# Altium integrated library Connectors.IntLib: 512 symbols (part 2 of 2) (continued)
## TermBlock_2Х7.5
designator KLV?  (value not drawn)
Note: Connector; Temp.Characteristic: -40C to +85C; Value: *; Publisher: Catcatcat Electronics; Website developer: http://catcatcat.d-lan.dp.ua/; Assembly type: Manual Part
footprint TermBlock_2Х7.5
pins: 1, 2

## TermBlock_2Х7.5R
designator KLR?  (value not drawn)
Note: Connector; Temp.Characteristic: -40C to +85C; Value: *; Publisher: Catcatcat Electronics; Website developer: http://catcatcat.d-lan.dp.ua/; Assembly type: Manual Part
footprint TermBlock_2Х7.5R
pins: 1, 2

## TermBlock_3Х3.5
designator KLV?  (value not drawn)
Note: Connector; Temp.Characteristic: -40C to +85C; Value: *; Publisher: Catcatcat Electronics; Website developer: http://catcatcat.d-lan.dp.ua/; Assembly type: Manual Part
footprint TermBlock_3Х3.5
pins: 1, 2, 3

## TermBlock_3Х5
designator KLV?  (value not drawn)
Note: Connector; Temp.Characteristic: -40C to +85C; Value: *; Publisher: Catcatcat Electronics; Website developer: http://catcatcat.d-lan.dp.ua/; Assembly type: Manual Part
footprint TermBlock_3Х5
pins: 1, 2, 3

## TermBlock_4
designator U?  (value not drawn)
Note: Connector; Temp.Characteristic: -40C to +85C; Value: *; Publisher: Catcatcat Electronics; Website developer: http://catcatcat.d-lan.dp.ua/; Assembly type: Manual Part
footprint TermBlock_4
pins: 1, 2, 3, 4

## USB-A-PLUG-SMT
designator DP?  (value not drawn)
Note: Connector; Temp.Characteristic: -40C to +85C; Value: *; Publisher: Catcatcat Electronics; Website developer: http://catcatcat.d-lan.dp.ua/; Assembly type: Manual Part
footprint USB-A-PLUG-SMT
pins: 1 Vdd, 2 D-, 3 D+, 4 Vss, 5 hidden, 6 hidden, 7 hidden, 8 hidden, 9 hidden, 10 hidden

## USB-A-RECEPTACLE-SMT
designator CON?  (value not drawn)
Note: Connector; Temp.Characteristic: -40C to +85C; Value: *; Publisher: Catcatcat Electronics; Website developer: http://catcatcat.d-lan.dp.ua/; Assembly type: Manual Part
footprint USB-A-RECEPTACLE
pins: 1 Vdd, 2 D-, 3 D+, 4 Vss, 5 hidden, 6 hidden

## USB-B
designator CON?  (value not drawn)
Note: Connector; Temp.Characteristic: -40C to +85C; Value: *; Publisher: Catcatcat Electronics; Website developer: http://catcatcat.d-lan.dp.ua/; Assembly type: Manual Part
footprint USB-B
pins: 1 Vcc, 2 D-, 3 D+, 4 Vss, 5 GND, 6 GND

## USB-B-MICRO
designator CON?  (value not drawn)
Note: Connector; Temp.Characteristic: -40C to +85C; Value: *; Publisher: Catcatcat Electronics; Website developer: http://catcatcat.d-lan.dp.ua/; Assembly type: Manual Part
footprint USB-B-MICRO
pins: 1 VUSB, 2 D-, 3 D+, 4 ID, 5 GND, 6 shield, 7 shield, 8 shield, 9 shield
text: micro-USB

## USB-B-RECEPTACLE
designator CON?  (value not drawn)
Note: Connector; Temp.Characteristic: -40C to +85C; Value: *; Publisher: Catcatcat Electronics; Website developer: http://catcatcat.d-lan.dp.ua/; Assembly type: Manual Part
footprint USB-B-RECEPTACLE
pins: 1 Vdd, 2 D-, 3 D+, 4 Vss, 5 GND, 6 GND, 7 hidden, 8 hidden

## USB-DS1095
designator CON?  (value not drawn)
Note: Connector; Temp.Characteristic: -40C to +85C; Value: *; Publisher: Catcatcat Electronics; Website developer: http://catcatcat.d-lan.dp.ua/; Assembly type: Manual Part
footprint USB-DS1095
pins: 1 Vdd, 2 D-, 3 D+, 4 Vss, 5 hidden, 6 hidden

## VL22
designator CON?  (value not drawn)
3.5 mm 300 V 8 A; Value: 15EDGR-3.5-12; Note: Connector; Temp.Characteristic: -40C to +85C; Voltage: 300 V 8 A; Package / Case: 3.5 mm; PartNumber Digi-Key: 15EDGR-3.5-12; Publisher: Catcatcat Electronics; Manufacturer: http://www.anytek.com.tw; Website developer: http://catcatcat.d-lan.dp.ua/; Assembly type: Manual Part
footprint VL22
pins: 1, 2, 3, 4, 5, 6, 7, 8, 9, 10, 11, 12, 13, 14, 15, 16, 17, 18, 19, 20, 21, 22

## VL24
designator CON?  (value not drawn)
3.5 mm 300 V 8 A; Value: 15EDGR-3.5-12; Note: Connector; Temp.Characteristic: -40C to +85C; Voltage: 300 V 8 A; Package / Case: 3.5 mm; PartNumber Digi-Key: 15EDGR-3.5-12; Publisher: Catcatcat Electronics; Manufacturer: http://www.anytek.com.tw; Website developer: http://catcatcat.d-lan.dp.ua/; Assembly type: Manual Part
footprint VL24
pins: 1, 2, 3, 4, 5, 6, 7, 8, 9, 10, 11, 12, 13, 14, 15, 16, 17, 18, 19, 20, 21, 22, 23, 24

## VL 04 1 3 x 1 0000 G
designator X?  (value not drawn)
3.5 mm 2*2P - 2*24P; Value: 2EDGRC-5.08-02; Pricing Аlternative: 0.006; Note: Connector; Temp.Characteristic: -40C to +85C; Voltage: 300 V; Package / Case: 5.08 mm; PartNumber Digi-Key: 2EDGRC-5.08-02; Pricing Digi-Key: 0.064; Publisher: Catcatcat Electronics; HelpURL: http://www.anytek.com.tw/UserUpFiles/20100614/4OFCs_FTjbzs.pdf; Manufacturer: http://www.anytek.com.tw/EN/index.aspx; Website developer: http://catcatcat.d-lan.dp.ua/; Assembly type: Manual Part
footprint VL 04 1 3 x 1 xxxx G
pins: 1, 2, 3, 4

## VL 06 1 3 x 1 0000 G
designator X?  (value not drawn)
3.5 mm 2*2P - 2*24P; Value: 2EDGRC-5.08-02; Pricing Аlternative: 0.006; Note: Connector; Temp.Characteristic: -40C to +85C; Voltage: 300 V; Package / Case: 5.08 mm; PartNumber Digi-Key: 2EDGRC-5.08-02; Pricing Digi-Key: 0.064; Publisher: Catcatcat Electronics; HelpURL: http://www.anytek.com.tw/UserUpFiles/20100614/4OFCs_FTjbzs.pdf; Manufacturer: http://www.anytek.com.tw/EN/index.aspx; Website developer: http://catcatcat.d-lan.dp.ua/; Assembly type: Manual Part
footprint VL 06 1 3 x 1 xxxx G
pins: 1, 2, 3, 4, 5, 6

## VL 08 1 3 x 1 0000 G
designator X?  (value not drawn)
3.5 mm 2*2P - 2*24P; Value: 2EDGRC-5.08-02; Pricing Аlternative: 0.006; Note: Connector; Temp.Characteristic: -40C to +85C; Voltage: 300 V; Package / Case: 5.08 mm; PartNumber Digi-Key: 2EDGRC-5.08-02; Pricing Digi-Key: 0.064; Publisher: Catcatcat Electronics; HelpURL: http://www.anytek.com.tw/UserUpFiles/20100614/4OFCs_FTjbzs.pdf; Manufacturer: http://www.anytek.com.tw/EN/index.aspx; Website developer: http://catcatcat.d-lan.dp.ua/; Assembly type: Manual Part
footprint VL 08 1 3 x 1 xxxx G
pins: 1, 2, 3, 4, 5, 6, 7, 8

## VL 10 1 3 x 1 0000 G
designator X?  (value not drawn)
3.5 mm 2*2P - 2*24P; Value: 2EDGRC-5.08-02; Pricing Аlternative: 0.006; Note: Connector; Temp.Characteristic: -40C to +85C; Voltage: 300 V; Package / Case: 5.08 mm; PartNumber Digi-Key: 2EDGRC-5.08-02; Pricing Digi-Key: 0.064; Publisher: Catcatcat Electronics; HelpURL: http://www.anytek.com.tw/UserUpFiles/20100614/4OFCs_FTjbzs.pdf; Manufacturer: http://www.anytek.com.tw/EN/index.aspx; Website developer: http://catcatcat.d-lan.dp.ua/; Assembly type: Manual Part
footprint VL 10 1 3 x 1 xxxx G
pins: 1, 2, 3, 4, 5, 6, 7, 8, 9, 10

## VL 12 1 3 x 1 0000 G
designator X?  (value not drawn)
3.5 mm 2*2P - 2*24P; Value: 2EDGRC-5.08-02; Pricing Аlternative: 0.006; Note: Connector; Temp.Characteristic: -40C to +85C; Voltage: 300 V; Package / Case: 5.08 mm; PartNumber Digi-Key: 2EDGRC-5.08-02; Pricing Digi-Key: 0.064; Publisher: Catcatcat Electronics; HelpURL: http://www.anytek.com.tw/UserUpFiles/20100614/4OFCs_FTjbzs.pdf; Manufacturer: http://www.anytek.com.tw/EN/index.aspx; Website developer: http://catcatcat.d-lan.dp.ua/; Assembly type: Manual Part
footprint VL 12 1 3 x 1 xxxx G
pins: 1, 2, 3, 4, 5, 6, 7, 8, 9, 10, 11, 12

## VX 04 1 1 x 1 xxxx G
designator X?  (value not drawn)
3.5 mm 2*2P - 2*24P; Value: 2EDGRC-5.08-02; Pricing Аlternative: 0.006; Note: Connector; Temp.Characteristic: -40C to +85C; Voltage: 300 V; Package / Case: 5.08 mm; PartNumber Digi-Key: 2EDGRC-5.08-02; Pricing Digi-Key: 0.064; Publisher: Catcatcat Electronics; HelpURL: http://www.anytek.com.tw/UserUpFiles/20100614/4OFCs_FTjbzs.pdf; Manufacturer: http://www.anytek.com.tw/EN/index.aspx; Website developer: http://catcatcat.d-lan.dp.ua/; Assembly type: Manual Part
footprint VX 04 1 1 x 1 xxxx G
pins: 1, 2, 3, 4

## VX 06 1 1 x 1 xxxx G
designator X?  (value not drawn)
3.5 mm 2*2P - 2*24P; Value: 2EDGRC-5.08-02; Pricing Аlternative: 0.006; Note: Connector; Temp.Characteristic: -40C to +85C; Voltage: 300 V; Package / Case: 5.08 mm; PartNumber Digi-Key: 2EDGRC-5.08-02; Pricing Digi-Key: 0.064; Publisher: Catcatcat Electronics; HelpURL: http://www.anytek.com.tw/UserUpFiles/20100614/4OFCs_FTjbzs.pdf; Manufacturer: http://www.anytek.com.tw/EN/index.aspx; Website developer: http://catcatcat.d-lan.dp.ua/; Assembly type: Manual Part
footprint VX 06 1 1 x 1 xxxx G
pins: 1, 2, 3, 4, 5, 6

## VX 08 1 1 x 1 xxxx G
designator X?  (value not drawn)
3.5 mm 2*2P - 2*24P; Value: 2EDGRC-5.08-02; Pricing Аlternative: 0.006; Note: Connector; Temp.Characteristic: -40C to +85C; Voltage: 300 V; Package / Case: 5.08 mm; PartNumber Digi-Key: 2EDGRC-5.08-02; Pricing Digi-Key: 0.064; Publisher: Catcatcat Electronics; HelpURL: http://www.anytek.com.tw/UserUpFiles/20100614/4OFCs_FTjbzs.pdf; Manufacturer: http://www.anytek.com.tw/EN/index.aspx; Website developer: http://catcatcat.d-lan.dp.ua/; Assembly type: Manual Part
footprint VX 08 1 1 x 1 xxxx G
pins: 1, 2, 3, 4, 5, 6, 7, 8

## VX 10 1 1 x 1 xxxx G
designator X?  (value not drawn)
3.5 mm 2*2P - 2*24P; Value: 2EDGRC-5.08-02; Pricing Аlternative: 0.006; Note: Connector; Temp.Characteristic: -40C to +85C; Voltage: 300 V; Package / Case: 5.08 mm; PartNumber Digi-Key: 2EDGRC-5.08-02; Pricing Digi-Key: 0.064; Publisher: Catcatcat Electronics; HelpURL: http://www.anytek.com.tw/UserUpFiles/20100614/4OFCs_FTjbzs.pdf; Manufacturer: http://www.anytek.com.tw/EN/index.aspx; Website developer: http://catcatcat.d-lan.dp.ua/; Assembly type: Manual Part
footprint VX 10 1 1 x 1 xxxx G
pins: 1, 2, 3, 4, 5, 6, 7, 8, 9, 10

## VX 12 1 1 x 1 xxxx G
designator X?  (value not drawn)
3.5 mm 2*2P - 2*24P; Value: 2EDGRC-5.08-02; Pricing Аlternative: 0.006; Note: Connector; Temp.Characteristic: -40C to +85C; Voltage: 300 V; Package / Case: 5.08 mm; PartNumber Digi-Key: 2EDGRC-5.08-02; Pricing Digi-Key: 0.064; Publisher: Catcatcat Electronics; HelpURL: http://www.anytek.com.tw/UserUpFiles/20100614/4OFCs_FTjbzs.pdf; Manufacturer: http://www.anytek.com.tw/EN/index.aspx; Website developer: http://catcatcat.d-lan.dp.ua/; Assembly type: Manual Part
footprint VX 12 1 1 x 1 xxxx G
pins: 1, 2, 3, 4, 5, 6, 7, 8, 9, 10, 11, 12

## WH-2
designator CON?  (value not drawn)
Note: Connector; Temp.Characteristic: -40C to +85C; Value: *; Publisher: Catcatcat Electronics; Website developer: http://catcatcat.d-lan.dp.ua/; Assembly type: Manual Part
footprint WH-2
pins: 1, 2

## WH-2R
designator CON?  (value not drawn)
Note: Connector; Temp.Characteristic: -40C to +85C; Value: *; Publisher: Catcatcat Electronics; Website developer: http://catcatcat.d-lan.dp.ua/; Assembly type: Manual Part
footprint WH-2R
pins: 1, 2

## WH-3
designator CON?  (value not drawn)
Note: Connector; Temp.Characteristic: -40C to +85C; Value: *; Publisher: Catcatcat Electronics; Website developer: http://catcatcat.d-lan.dp.ua/; Assembly type: Manual Part
footprint WH-3
pins: 1, 2, 3

## WH-3R
designator CON?  (value not drawn)
Note: Connector; Temp.Characteristic: -40C to +85C; Value: *; Publisher: Catcatcat Electronics; Website developer: http://catcatcat.d-lan.dp.ua/; Assembly type: Manual Part
footprint WH-3R
pins: 1, 2, 3

## WH-4
designator CON?  (value not drawn)
Note: Connector; Temp.Characteristic: -40C to +85C; Value: *; Publisher: Catcatcat Electronics; Website developer: http://catcatcat.d-lan.dp.ua/; Assembly type: Manual Part
footprint WH-4
pins: 1, 2, 3, 4

## WH-4R
designator CON?  (value not drawn)
Note: Connector; Temp.Characteristic: -40C to +85C; Value: *; Publisher: Catcatcat Electronics; Website developer: http://catcatcat.d-lan.dp.ua/; Assembly type: Manual Part
footprint WH-4R
pins: 1, 2, 3, 4

## WH-5
designator CON?  (value not drawn)
Note: Connector; Temp.Characteristic: -40C to +85C; Value: *; Publisher: Catcatcat Electronics; Website developer: http://catcatcat.d-lan.dp.ua/; Assembly type: Manual Part
footprint WH-5
pins: 1, 2, 3, 4, 5

## WH-5R
designator CON?  (value not drawn)
Note: Connector; Temp.Characteristic: -40C to +85C; Value: *; Publisher: Catcatcat Electronics; Website developer: http://catcatcat.d-lan.dp.ua/; Assembly type: Manual Part
footprint WH-5R
pins: 1, 2, 3, 4, 5

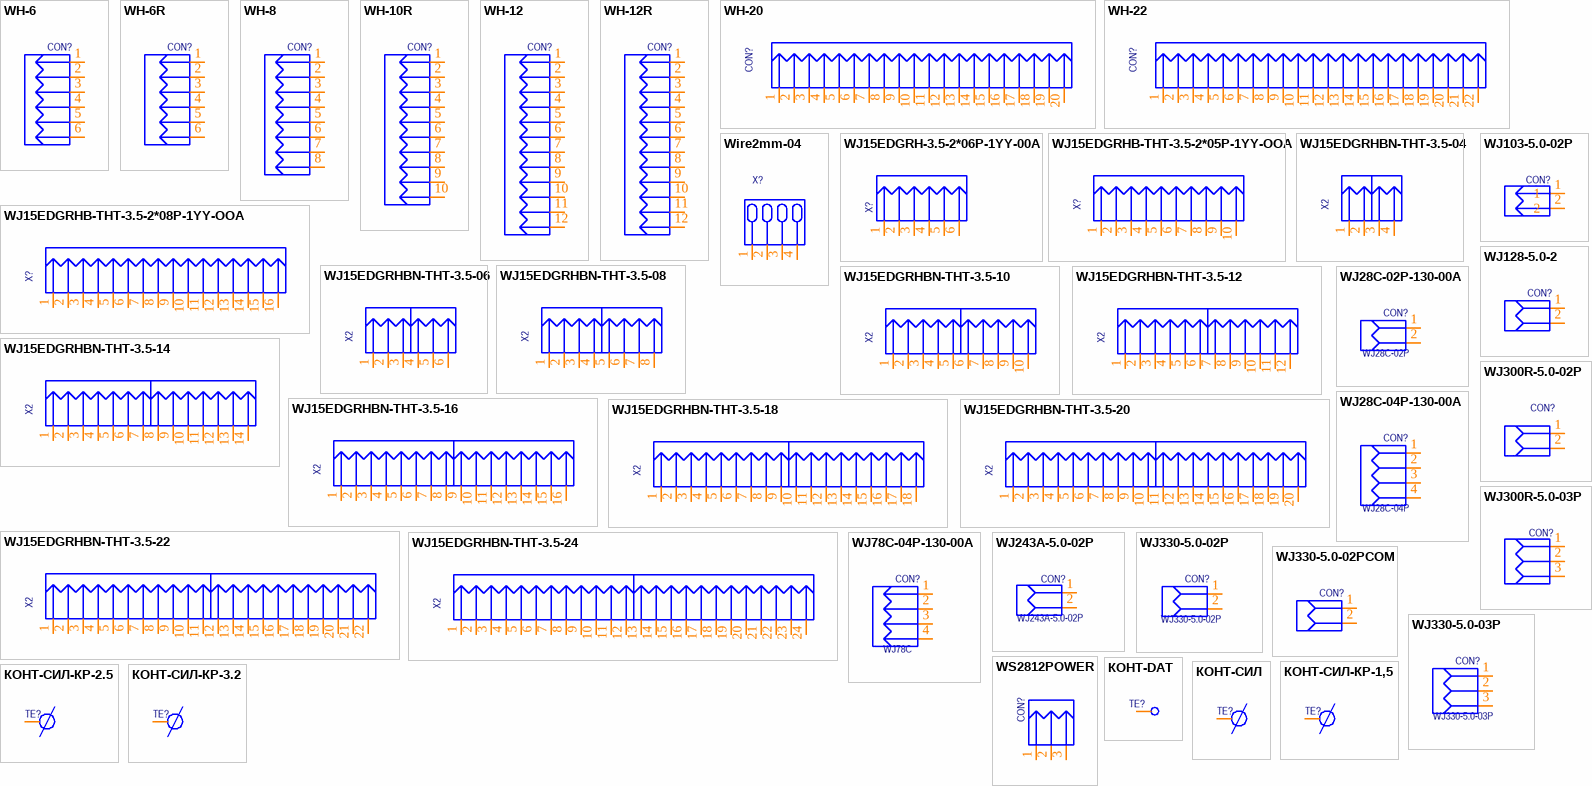
[diagram p12: symbols WH-6 to КОНТ-СИЛ-КР-3.2]

## WH-6
designator CON?  (value not drawn)
Note: Connector; Temp.Characteristic: -40C to +85C; Value: *; Publisher: Catcatcat Electronics; Website developer: http://catcatcat.d-lan.dp.ua/; Assembly type: Manual Part
footprint WH-6
pins: 1, 2, 3, 4, 5, 6

## WH-6R
designator CON?  (value not drawn)
Note: Connector; Temp.Characteristic: -40C to +85C; Value: *; Publisher: Catcatcat Electronics; Website developer: http://catcatcat.d-lan.dp.ua/; Assembly type: Manual Part
footprint WH-6R
pins: 1, 2, 3, 4, 5, 6

## WH-8
designator CON?  (value not drawn)
Note: Connector; Temp.Characteristic: -40C to +85C; Value: *; Publisher: Catcatcat Electronics; Website developer: http://catcatcat.d-lan.dp.ua/; Assembly type: Manual Part
footprint WH-8
pins: 1, 2, 3, 4, 5, 6, 7, 8

## WH-10R
designator CON?  (value not drawn)
Note: Connector; Temp.Characteristic: -40C to +85C; Value: *; Publisher: Catcatcat Electronics; Website developer: http://catcatcat.d-lan.dp.ua/; Assembly type: Manual Part
footprint WH-10R
pins: 1, 2, 3, 4, 5, 6, 7, 8, 9, 10

## WH-12
designator CON?  (value not drawn)
Note: Connector; Temp.Characteristic: -40C to +85C; Value: *; Publisher: Catcatcat Electronics; Website developer: http://catcatcat.d-lan.dp.ua/; Assembly type: Manual Part
footprint WH-12
pins: 1, 2, 3, 4, 5, 6, 7, 8, 9, 10, 11, 12

## WH-12R
designator CON?  (value not drawn)
Note: Connector; Temp.Characteristic: -40C to +85C; Value: *; Publisher: Catcatcat Electronics; Website developer: http://catcatcat.d-lan.dp.ua/; Assembly type: Manual Part
footprint WH-12R
pins: 1, 2, 3, 4, 5, 6, 7, 8, 9, 10, 11, 12

## WH-20
designator CON?  (value not drawn)
Note: Connector; Temp.Characteristic: -40C to +85C; Value: *; Publisher: Catcatcat Electronics; Website developer: http://catcatcat.d-lan.dp.ua/; Assembly type: Manual Part
footprint WH-20
pins: 1, 2, 3, 4, 5, 6, 7, 8, 9, 10, 11, 12, 13, 14, 15, 16, 17, 18, 19, 20

## WH-22
designator CON?  (value not drawn)
Note: Connector; Temp.Characteristic: -40C to +85C; Value: *; Publisher: Catcatcat Electronics; Website developer: http://catcatcat.d-lan.dp.ua/; Assembly type: Manual Part
footprint WH-22
pins: 1, 2, 3, 4, 5, 6, 7, 8, 9, 10, 11, 12, 13, 14, 15, 16, 17, 18, 19, 20, 21, 22

## Wire2mm-04
designator X?  (value not drawn)
2.0 mm; Value: 5*2mm; Pricing Аlternative: 0; Note: Connector; Temp.Characteristic: -40C to +85C; Pricing Digi-Key: 0; Publisher: Catcatcat Electronics; Manufacturer: http://www.jinlingdz.com; Website developer: http://catcatcat.d-lan.dp.ua/; Assembly type: Manual Part
footprint Wire2mm-04 (2.00 mm)
pins: 1, 2, 3, 4

## WJ15EDGRH-3.5-2*06P-1YY-00A
designator X?  (value not drawn)
3.5 mm 2*2P - 2*24P; Value: 2EDGRC-5.08-02; Pricing Аlternative: 0.006; Note: Connector; Temp.Characteristic: -40C to +85C; Voltage: 300 V; Package / Case: 5.08 mm; PartNumber Digi-Key: 2EDGRC-5.08-02; Pricing Digi-Key: 0.064; Publisher: Catcatcat Electronics; HelpURL: http://www.anytek.com.tw/UserUpFiles/20100614/4OFCs_FTjbzs.pdf; Manufacturer: http://www.anytek.com.tw/EN/index.aspx; Website developer: http://catcatcat.d-lan.dp.ua/; Assembly type: Manual Part
footprint WJ15EDGRH-3.5-2*06P-1YY-00A
pins: 1, 2, 3, 4, 5, 6

## WJ15EDGRHB-THT-3.5-2*05P-1YY-OOA
designator X?  (value not drawn)
3.5 mm 300V/8A; Manufacturer PartNumber: jx-017; Value: WJ15EDGRHBN-THT-3.5; Note: Connector; Temp.Characteristic: -40C to +85C; Package / Case: 3.5 mm; PartNumber Digi-Key: jx-017; Publisher: Catcatcat Electronics; Voltage: 300V/8A; Manufacturer: http://en.china-wj.com/index.html; Website developer: http://catcatcat.d-lan.dp.ua/; Assembly type: Manual Part
footprint WJ15EDGRHB-THT-3.5-2*05P-1YY-OOA
pins: 1, 2, 3, 4, 5, 6, 7, 8, 9, 10

## WJ15EDGRHB-THT-3.5-2*08P-1YY-OOA
designator X?  (value not drawn)
3.5 mm 300V/8A; Manufacturer PartNumber: jx-017; Value: WJ15EDGRHBN-THT-3.5; Note: Connector; Temp.Characteristic: -40C to +85C; Package / Case: 3.5 mm; PartNumber Digi-Key: jx-017; Publisher: Catcatcat Electronics; Voltage: 300V/8A; Manufacturer: http://en.china-wj.com/index.html; Website developer: http://catcatcat.d-lan.dp.ua/; Assembly type: Manual Part
footprint WJ15EDGRHB-THT-3.5-2*08P-1YY-OOA
pins: 1, 2, 3, 4, 5, 6, 7, 8, 9, 10, 11, 12, 13, 14, 15, 16

## WJ15EDGRHBN-THT-3.5-04
designator X2  (value not drawn)
3.5 mm 300V/8A; Manufacturer PartNumber: jx-017; Value: WJ15EDGRHBN-THT-3.5; Note: Connector; Temp.Characteristic: -40C to +85C; Package / Case: 3.5 mm; PartNumber Digi-Key: jx-017; Publisher: Catcatcat Electronics; Voltage: 300V/8A; Manufacturer: http://en.china-wj.com/index.html; Website developer: http://catcatcat.d-lan.dp.ua/; Assembly type: Manual Part
footprint WJ15EDGRHBN-THT-3.5-04
pins: 1, 2, 3, 4

## WJ15EDGRHBN-THT-3.5-06
designator X2  (value not drawn)
3.5 mm 300V/8A; Manufacturer PartNumber: jx-017; Value: WJ15EDGRHBN-THT-3.5; Note: Connector; Temp.Characteristic: -40C to +85C; Package / Case: 3.5 mm; PartNumber Digi-Key: jx-017; Publisher: Catcatcat Electronics; Voltage: 300V/8A; Manufacturer: http://en.china-wj.com/index.html; Website developer: http://catcatcat.d-lan.dp.ua/; Assembly type: Manual Part
footprint WJ15EDGRHBN-THT-3.5-06
pins: 1, 2, 3, 4, 5, 6

## WJ15EDGRHBN-THT-3.5-08
designator X2  (value not drawn)
3.5 mm 300V/8A; Manufacturer PartNumber: jx-017; Value: WJ15EDGRHBN-THT-3.5; Note: Connector; Temp.Characteristic: -40C to +85C; Package / Case: 3.5 mm; PartNumber Digi-Key: jx-017; Publisher: Catcatcat Electronics; Voltage: 300V/8A; Manufacturer: http://en.china-wj.com/index.html; Website developer: http://catcatcat.d-lan.dp.ua/; Assembly type: Manual Part
footprint WJ15EDGRHBN-THT-3.5-08
pins: 1, 2, 3, 4, 5, 6, 7, 8

## WJ15EDGRHBN-THT-3.5-10
designator X2  (value not drawn)
3.5 mm 300V/8A; Manufacturer PartNumber: jx-017; Value: WJ15EDGRHBN-THT-3.5; Note: Connector; Temp.Characteristic: -40C to +85C; Package / Case: 3.5 mm; PartNumber Digi-Key: jx-017; Publisher: Catcatcat Electronics; Voltage: 300V/8A; Manufacturer: http://en.china-wj.com/index.html; Website developer: http://catcatcat.d-lan.dp.ua/; Assembly type: Manual Part
footprint WJ15EDGRHBN-THT-3.5-10
pins: 1, 2, 3, 4, 5, 6, 7, 8, 9, 10

## WJ15EDGRHBN-THT-3.5-12
designator X2  (value not drawn)
3.5 mm 300V/8A; Manufacturer PartNumber: jx-017; Value: WJ15EDGRHBN-THT-3.5; Note: Connector; Temp.Characteristic: -40C to +85C; Package / Case: 3.5 mm; PartNumber Digi-Key: jx-017; Publisher: Catcatcat Electronics; Voltage: 300V/8A; Manufacturer: http://en.china-wj.com/index.html; Website developer: http://catcatcat.d-lan.dp.ua/; Assembly type: Manual Part
footprint WJ15EDGRHBN-THT-3.5-12
pins: 1, 2, 3, 4, 5, 6, 7, 8, 9, 10, 11, 12

## WJ15EDGRHBN-THT-3.5-14
designator X2  (value not drawn)
3.5 mm 300V/8A; Manufacturer PartNumber: jx-017; Value: WJ15EDGRHBN-THT-3.5; Note: Connector; Temp.Characteristic: -40C to +85C; Package / Case: 3.5 mm; PartNumber Digi-Key: jx-017; Publisher: Catcatcat Electronics; Voltage: 300V/8A; Manufacturer: http://en.china-wj.com/index.html; Website developer: http://catcatcat.d-lan.dp.ua/; Assembly type: Manual Part
footprint WJ15EDGRHBN-THT-3.5-14
pins: 1, 2, 3, 4, 5, 6, 7, 8, 9, 10, 11, 12, 13, 14

## WJ15EDGRHBN-THT-3.5-16
designator X2  (value not drawn)
3.5 mm 300V/8A; Manufacturer PartNumber: jx-017; Value: WJ15EDGRHBN-THT-3.5; Note: Connector; Temp.Characteristic: -40C to +85C; Package / Case: 3.5 mm; PartNumber Digi-Key: jx-017; Publisher: Catcatcat Electronics; Voltage: 300V/8A; Manufacturer: http://en.china-wj.com/index.html; Website developer: http://catcatcat.d-lan.dp.ua/; Assembly type: Manual Part
footprint WJ15EDGRHBN-THT-3.5-16
pins: 1, 2, 3, 4, 5, 6, 7, 8, 9, 10, 11, 12, 13, 14, 15, 16

## WJ15EDGRHBN-THT-3.5-18
designator X2  (value not drawn)
3.5 mm 300V/8A; Manufacturer PartNumber: jx-017; Value: WJ15EDGRHBN-THT-3.5; Note: Connector; Temp.Characteristic: -40C to +85C; Package / Case: 3.5 mm; PartNumber Digi-Key: jx-017; Publisher: Catcatcat Electronics; Voltage: 300V/8A; Manufacturer: http://en.china-wj.com/index.html; Website developer: http://catcatcat.d-lan.dp.ua/; Assembly type: Manual Part
footprint WJ15EDGRHBN-THT-3.5-18
pins: 1, 2, 3, 4, 5, 6, 7, 8, 9, 10, 11, 12, 13, 14, 15, 16, 17, 18

## WJ15EDGRHBN-THT-3.5-20
designator X2  (value not drawn)
3.5 mm 300V/8A; Manufacturer PartNumber: jx-017; Value: WJ15EDGRHBN-THT-3.5; Note: Connector; Temp.Characteristic: -40C to +85C; Package / Case: 3.5 mm; PartNumber Digi-Key: jx-017; Publisher: Catcatcat Electronics; Voltage: 300V/8A; Manufacturer: http://en.china-wj.com/index.html; Website developer: http://catcatcat.d-lan.dp.ua/; Assembly type: Manual Part
footprint WJ15EDGRHBN-THT-3.5-20
pins: 1, 2, 3, 4, 5, 6, 7, 8, 9, 10, 11, 12, 13, 14, 15, 16, 17, 18, 19, 20

## WJ15EDGRHBN-THT-3.5-22
designator X2  (value not drawn)
3.5 mm 300V/8A; Manufacturer PartNumber: jx-017; Value: WJ15EDGRHBN-THT-3.5; Note: Connector; Temp.Characteristic: -40C to +85C; Package / Case: 3.5 mm; PartNumber Digi-Key: jx-017; Publisher: Catcatcat Electronics; Voltage: 300V/8A; Manufacturer: http://en.china-wj.com/index.html; Website developer: http://catcatcat.d-lan.dp.ua/; Assembly type: Manual Part
footprint WJ15EDGRHBN-THT-3.5-22
pins: 1, 2, 3, 4, 5, 6, 7, 8, 9, 10, 11, 12, 13, 14, 15, 16, 17, 18, 19, 20, 21, 22

## WJ15EDGRHBN-THT-3.5-24
designator X2  (value not drawn)
3.5 mm 300V/8A; Manufacturer PartNumber: jx-017; Value: WJ15EDGRHBN-THT-3.5; Note: Connector; Temp.Characteristic: -40C to +85C; Package / Case: 3.5 mm; PartNumber Digi-Key: jx-017; Publisher: Catcatcat Electronics; Voltage: 300V/8A; Manufacturer: http://en.china-wj.com/index.html; Website developer: http://catcatcat.d-lan.dp.ua/; Assembly type: Manual Part
footprint WJ15EDGRHBN-THT-3.5-24
pins: 1, 2, 3, 4, 5, 6, 7, 8, 9, 10, 11, 12, 13, 14, 15, 16, 17, 18, 19, 20, 21, 22, 23, 24

## WJ28C-02P-130-00A
designator CON?  value WJ28C-02P  (hidden comment: WJ28C-02P-130-00A)
Note: Connector; Temp.Characteristic: -40C to +85C; Publisher: Catcatcat Electronics; Website developer: http://catcatcat.d-lan.dp.ua/; Assembly type: Manual Part
footprint WJ28C-02P
pins: 1, 2

## WJ28C-04P-130-00A
designator CON?  value WJ28C-04P  (hidden comment: *)
Note: Connector; Temp.Characteristic: -40C to +85C; Publisher: Catcatcat Electronics; Website developer: http://catcatcat.d-lan.dp.ua/; Assembly type: Manual Part
footprint WJ28C-04P
pins: 1, 2, 3, 4

## WJ78C-04P-130-00A
designator CON?  value WJ78C  (hidden comment: *)
Manufacturer: CIXI WANJIE ELECTRONIC CO., LTD; Manufacturer PartNumber: WJ78C-04P-130-00A; PartNumber Аlternative: 016844; Pricing Аlternative: 0,5050; Note: Connector; Temp.Characteristic: -40C to +85C; Voltage: 600V 40A; Dealer Аlternative: https://voron.ua/catalog/016844; Package / Case: 13mm; Publisher: Catcatcat Electronics; HelpURL: http://www.china-wj.com/En/product_detail1/id/300.html; Website developer: http://catcatcat.d-lan.dp.ua/; Assembly type: Manual Part
footprint WJ78C-04P-130-00A
footprint WJ78C-04P-130-00A_no3D
pins: 1, 2, 3, 4

## WJ103-5.0-02P
designator CON?  (value not drawn)
Note: Connector; Temp.Characteristic: -40C to +85C; Value: *; Publisher: Catcatcat Electronics; Website developer: http://catcatcat.d-lan.dp.ua/; Assembly type: Manual Part
footprint WJ103-5.0-02P
pins: 1, 2

## WJ128-5.0-2
designator CON?  (value not drawn)
Note: Connector; Temp.Characteristic: -40C to +85C; Value: *; Publisher: Catcatcat Electronics; Website developer: http://catcatcat.d-lan.dp.ua/; Assembly type: Manual Part
footprint WJ128-5.0-2
pins: 1, 2

## WJ243A-5.0-02P
designator CON?  value WJ243A-5.0-02P  (hidden comment: *)
Note: Connector; Temp.Characteristic: -40C to +85C; Publisher: Catcatcat Electronics; HelpURL: http://www.china-wj.com/En/product_detail1/id/195.html; Website developer: http://catcatcat.d-lan.dp.ua/; Assembly type: Manual Part
footprint WJ243A-5.0-02P
footprint WJ243A-5.0-02P no3D
pins: 1, 2

## WJ300R-5.0-02P
designator CON?  (value not drawn)
Note: Connector; Temp.Characteristic: -40C to +85C; Value: *; Publisher: Catcatcat Electronics; Website developer: http://catcatcat.d-lan.dp.ua/; Assembly type: Manual Part
footprint WJ300R-5.0-02P
pins: 1, 2

## WJ300R-5.0-03P
designator CON?  (value not drawn)
Note: Connector; Temp.Characteristic: -40C to +85C; Value: *; Publisher: Catcatcat Electronics; Website developer: http://catcatcat.d-lan.dp.ua/; Assembly type: Manual Part
footprint WJ300R-5.0-03P
pins: 1, 2, 3

## WJ330-5.0-02P
designator CON?  value WJ330-5.0-02P  (hidden comment: *)
Note: Connector; Temp.Characteristic: -40C to +85C; HelpURL: http://www.china-wj.com/En/product_detail1/id/133.html; Publisher: Catcatcat Electronics; Website developer: http://catcatcat.d-lan.dp.ua/; Assembly type: Manual Part
footprint WJ330-5.0-02P
pins: 1, 2

## WJ330-5.0-02PCOM
designator CON?  (value not drawn)
Note: Connector; Temp.Characteristic: -40C to +85C; Value: *; Publisher: Catcatcat Electronics; Website developer: http://catcatcat.d-lan.dp.ua/; Assembly type: Manual Part
footprint WJ330-5.0-02PCOM
pins: 1, 2

## WJ330-5.0-03P
designator CON?  value WJ330-5.0-03P  (hidden comment: *)
Manufacturer: WANJIE; Note: Connector; Temp.Characteristic: -40C to +85C; Publisher: Catcatcat Electronics; HelpURL: http://www.china-wj.com/En/product_detail1/id/133.html; Website developer: http://catcatcat.d-lan.dp.ua/; Assembly type: Manual Part
footprint WJ330-5.0-03P
pins: 1, 2, 3

## WS2812POWER
designator CON?  (value not drawn)
3A; Value: 15EDGR-3.5-03; Pricing Аlternative: 0.020; Note: Connector; Temp.Characteristic: -40C to +85C; Voltage: 300 V 8 A; ComponentLink2URL: http://www.kosmodrom.com.ua/pdf/15EDGRC-35.pdf; Dealer Digi-Key: https://detail.1688.com/offer/539192620837.html; Package / Case: 3.5 mm; PartNumber Digi-Key: 15EDGR-3.5-03; Pricing Digi-Key: 0.077; Publisher: Catcatcat Electronics; Website developer: http://catcatcat.d-lan.dp.ua/; Assembly type: Manual Part
footprint WS2812POWER
pins: 1, 2, 3

## КОНТ-DAT
designator TE?  (value not drawn)
Note: Connector; Temp.Characteristic: -40C to +85C; Value: *; Publisher: Catcatcat Electronics; Website developer: http://catcatcat.d-lan.dp.ua/; Assembly type: Manual Part
footprint КОНТ-DAT
pins: 1 0

## КОНТ-СИЛ
designator TE?  (value not drawn)
Note: Connector; Temp.Characteristic: -40C to +85C; Value: *; Publisher: Catcatcat Electronics; Website developer: http://catcatcat.d-lan.dp.ua/; Assembly type: Manual Part
footprint КОНТ-СИЛ
pins: 1 0

## КОНТ-СИЛ-КР-1,5
designator TE?  (value not drawn)
Note: Connector; Temp.Characteristic: -40C to +85C; Value: *; Publisher: Catcatcat Electronics; Website developer: http://catcatcat.d-lan.dp.ua/; Assembly type: Manual Part
footprint КОНТ-СИЛ-КР-1,5
pins: 1 0

## КОНТ-СИЛ-КР-2.5
designator TE?  (value not drawn)
Note: Connector; Temp.Characteristic: -40C to +85C; Value: *; Publisher: Catcatcat Electronics; Website developer: http://catcatcat.d-lan.dp.ua/; Assembly type: Manual Part
footprint КОНТ-СИЛ-КР-2.5
pins: 1 0

## КОНТ-СИЛ-КР-3.2
designator TE?  (value not drawn)
Note: Connector; Temp.Characteristic: -40C to +85C; Value: *; Publisher: Catcatcat Electronics; Website developer: http://catcatcat.d-lan.dp.ua/; Assembly type: Manual Part
footprint КОНТ-СИЛ-КР-3.2
pins: 1 0

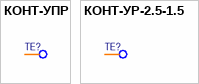
[diagram p13: symbols КОНТ-УПР to КОНТ-УР-2.5-1.5]

## КОНТ-УПР
designator TE?  (value not drawn)
Note: Connector; Temp.Characteristic: -40C to +85C; Value: *; Publisher: Catcatcat Electronics; Website developer: http://catcatcat.d-lan.dp.ua/; Assembly type: Manual Part
footprint КОНТ-УР
pins: 1 0

## КОНТ-УР-2.5-1.5
designator TE?  (value not drawn)
Note: Connector; Temp.Characteristic: -40C to +85C; Value: *; Publisher: Catcatcat Electronics; Website developer: http://catcatcat.d-lan.dp.ua/; Assembly type: Manual Part
footprint КОНТ-УР-2.5-1.5
pins: 1